# Altium integrated library Self made library.IntLib: 370 symbols (part 2 of 3)
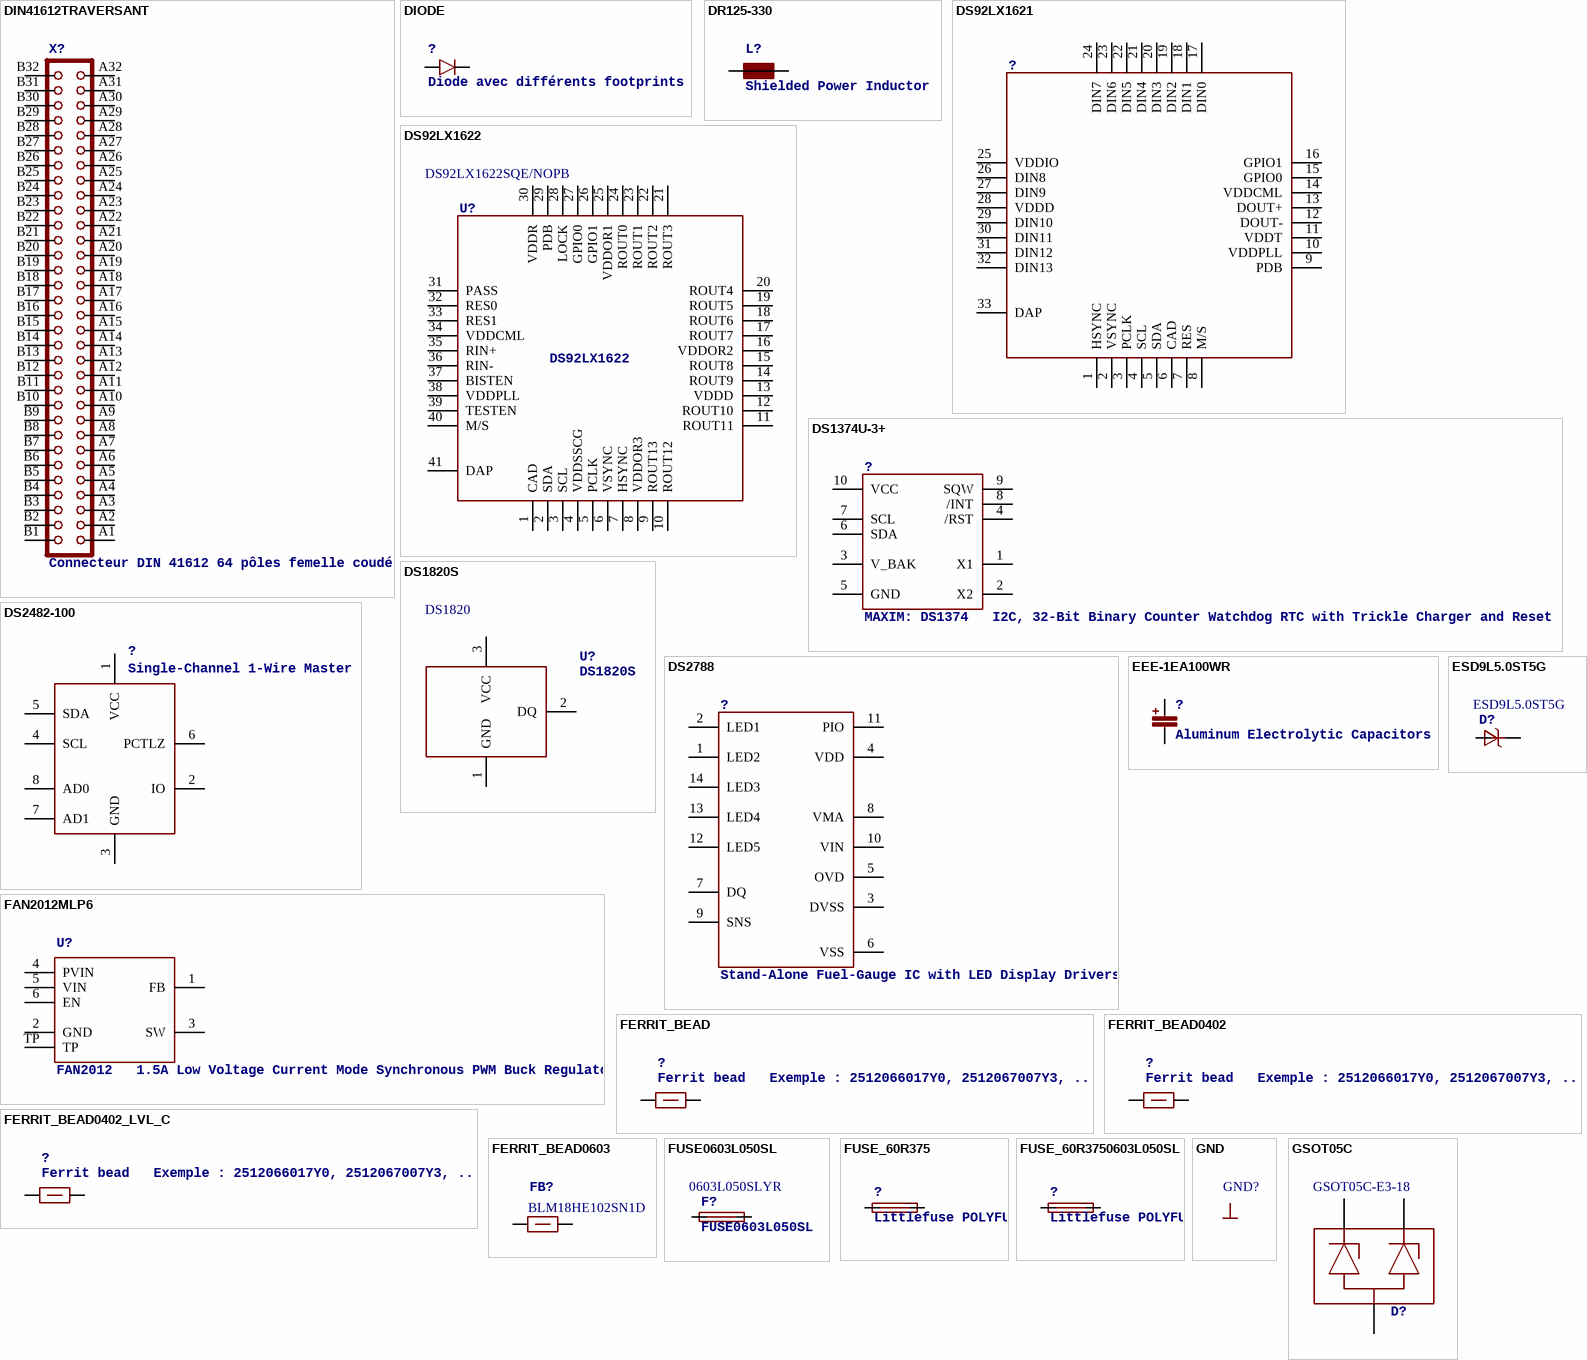
[diagram p21: symbols DIN41612TRAVERSANT to GSOT05C]

## EEE-1EA100WR
designator ?, comment Aluminum Electrolytic Capacitors
MANUFACTURER: Panasonic; MANUFACTURER_PART_NUMBER: EEE-1EA100WR; UNIT_PRICE: 0.304; SUPPLIER: mouser; SUPPLIER_PART_NUMBER: 667-EEE-1EA100WR
footprint EEE-1EA100WR
pins: +, -

## ESD9L5.0ST5G
designator D?, comment Manufacturer Part Number 1: ESD9L5.0ST5G  (hidden comment: ESD Protection Diodes with Ultra−Low Capacitance)
MANUFACTURER: ON Semiconductor; UNIT_PRICE: 0.5; Description 1: Diodes TVS - Parasurtenseurs ESD PROT DIODE UNI; Tension de rupture: 5.4 V; Capacité électrique: 0.5 pF; Blocage de la tension: 9.8 V; Tension de fonctionnement: 5 V; Package/Boîte: SOD-923; Conditionnement: Reel; Série: ESD9L; Style du raccordement: SMD/SMT; Courant de surtension de pointe: 1 A; Température de fonctionnement max.: + 125 C; Température de fonctionnement min.: - 55 C; Polarité: Unidirectional; Catégorie du produit: Low Capacitance ESD; Quantité standard du lot: 8000; MANUFACTURER_PART_NUMBER: ESD9L5.0ST5G; SUPPLIER: mouser; SUPPLIER_PART_NUMBER: 863-ESD9L5.0ST5G; Supplier 1: Mouser; Supplier Part Number 1: 863-ESD9L5.0ST5G; Manufacturer 1: ON Semiconductor; RoHS: RoHS Compliant; Category: Diodes TVS - Parasurtenseurs; Stock 1: 12650; Pricing 1: 1=0.465, 10=0.271, 100=0.128, 1000=0.099, 2500=0.084, 8000=0.076, 24000=0.071, 48000=0.064, 96000=0.062 (CHF); Dimensions: 0.6 mm W x 0.8 mm L x 0.37 mm H; Marque: ON Semiconductor; Style de montage: SMD/SMT; Fabricant: ON Semiconductor; RoHS - Mouser: Y; Minimum Order Quantity: 1; Reeling: True; ComponentLink1URL: http://www.mouser.com/ds/2/308/ESD9L-D-278322.pdf; ComponentLink1Description: http://www.mouser.com/ds/2/308/ESD9L-D-278322.pdf
footprint ESD9L5.0ST5G
pins: A, C

## FAN2012MLP6
designator U?, comment FAN2012   1.5A Low Voltage Current Mode Synchronous PWM Buck Regulator
footprint MLP6
pins: 1 FB, 2 GND, 3 SW, 4 PVIN, 5 VIN, 6 EN, TP

## FERRIT_BEAD
designator ?, comment Ferrit bead   Exemple : 2512066017Y0, 2512067007Y3, ...
footprint 1206
pins: 1, 2

## FERRIT_BEAD0402
designator ?, comment Ferrit bead   Exemple : 2512066017Y0, 2512067007Y3, ...
footprint R0402
pins: 1, 2

## FERRIT_BEAD0402_LVL_C
designator ?, comment Ferrit bead   Exemple : 2512066017Y0, 2512067007Y3, ...
MANUFACTURER: Murata; MANUFACTURER_PART_NUMBER: BLM15AX102SN1D; UNIT_PRICE: 0.12; SUPPLIER: Mouser; SUPPLIER_PART_NUMBER: 81-BLM15AX102SN1D
footprint C0402_LVL_C
pins: 1, 2

## FERRIT_BEAD0603
designator FB?  Manufacturer Part Number: BLM18HE102SN1D
Manufacturer: Murata Electronics; Impedance: 1 kOhms; Maximum DC Current: 600 mA; Maximum DC Resistance: 350 mOhms; Tolerance: 25 %; Case Height: 0.8 mm; Case Length: 1.6 mm; Test Frequency: 100 MHz; Supplier 1: Mouser; RoHS: RoHS Compliant; Category: EMI Filter Beads, Chips & Arrays; Stock 1: 5973; Pricing 1: 1=0.216, 10=0.119, 100=0.082, 500=0.074, 1000=0.061, 4000=0.056, 8000=0.048, 24000=0.046 (CHF); Capacitance: -; Dimensions: 0.8 mm W x 1.6 mm L x 0.8 mm H; Operating Temperature Range: - 55 C to + 125 C; Package/Case: 0603 (1608 metric); Packaging: Reel; Product: Ferrite Chip Beads; Series: BLM; Termination Style: SMD/SMT; Brand: Murata Electronics; Case Width: 0.8 mm; Product Category: SMD EMI Filters/Chip Ferrite Beads; Standard Pack Qty: 4000; RoHS - Mouser: Y; Minimum Order Quantity: 1; Reeling: True; ComponentLink1URL: http://search.murata.co.jp/Ceramy/CatalogAction.do?sHinnm=?&nbsp&sNHinnm=BLM18HE102SN1D&sNhin_key=BLM18HE102SN1D&sLang=en; ComponentLink1Description: http://search.murata.co.jp/Ceramy/CatalogAction.do?sHinnm=?&nbsp&sNHinnm=BLM18HE102SN1D&sNhin_key=BLM18HE102SN1D&sLang=en; Supplier Part Number 1: 81-BLM18HE102SN1D
footprint 0603
pins: 1, 2

## FUSE0603L050SL
designator F?  Manufacturer Part Number 1: 0603L050SLYR
MANUFACTURER: Littelfuse; UNIT_PRICE: 1.74; Description 1: Fusibles réarmables - PPTC 6V POLYFUSE 0603 LoRho SL 0.50A; Plage de températures de fonctionnement: - 40 C to + 85 C; Package/Boîte: 0603 (1608 metric); Conditionnement: Reel; Résistance: 350 mOhms; Série: LoRho; Style du raccordement: SMD/SMT; Type: PolyFuse Resettable PTC; Courant nominal maximal: 50 A; Courant maintenu: 0.5 A; Tension max.: 6 V; Courant de déclenchement: 1 A; Quantité standard du lot: 4000; MANUFACTURER_PART_NUMBER: 0603L050SLYR; SUPPLIER: Mouser; SUPPLIER_PART_NUMBER: 576-0603L050SLYR; Supplier 1: Mouser; Supplier Part Number 1: 576-0603L050SLYR; Manufacturer 1: Littelfuse; RoHS: RoHS Compliant; Category: Fusibles réarmables - PPTC; Stock 1: 2638; Pricing 1: 1=1.81, 10=1.55, 50=1.32, 100=1.11, 200=1.08, 500=0.919, 1000=0.816, 4000=0.685 (CHF); Dimensions: 1.8 mm L x 1 mm W x 0.75 mm  H; Marque: Littelfuse; Style de montage: SMD/SMT; Fabricant: Littelfuse; RoHS - Mouser: Y; Minimum Order Quantity: 1; Reeling: True; ComponentLink1URL: http://www.mouser.com/ds/2/240/Littelfuse_PTC_LoRho_Datasheet.pdf-365270.pdf; ComponentLink1Description: http://www.mouser.com/ds/2/240/Littelfuse_PTC_LoRho_Datasheet.pdf-365270.pdf
footprint R0603
pins: 1, 2

## FUSE_60R375
designator ?, comment Littlefuse POLYFUSE® Resettable PTCs 60R series60R375XH: Ihold=2.36 A@ 60°C; 60V; sw=7.5A @23°C
footprint LF60R375
pins: 1, 2

## FUSE_60R3750603L050SL
designator ?, comment Littlefuse POLYFUSE® Resettable PTCs 60R series60R375XH: Ihold=2.36 A@ 60°C; 60V; sw=7.5A @23°C
footprint 0603
pins: 1 2, 2 1

## GND
designator GND?
pins: ?1 GND (oe)

## GSOT05C
designator D?, comment Manufacturer Part Number 1: GSOT05C-E3-18  (hidden comment: Two-Line ESD Protection in SOT-23)
MANUFACTURER: Vishay Semiconductors; MANUFACTURER_PART_NUMBER: GSOT05C-E3-08; UNIT_PRICE: 0.49; Description 1: Barrettes de diodes TVS 5.0 Volt 300 Watt Common Anode; Tension de rupture: 6.8 V; Capacité électrique: 260 pF; Blocage de la tension: 7 V; Tension de fonctionnement: 5 V; Package/Boîte: SOT-23-3; Conditionnement: Reel; Série: GSOT05C; Style du raccordement: SMD/SMT; Canaux: 2 Channel; Courant de surtension de pointe: 30 A; Fabricant: Vishay; Température de fonctionnement max.: + 150 C; Température de fonctionnement min.: - 55 C; Dissipation de la puissance d'impulsion de crête: 612 W; Polarité: Bidirectional; Catégorie du produit: Transient Voltage Suppressors; Product Status: New at Mouser; SUPPLIER: mouser; SUPPLIER_PART_NUMBER: 78-GSOT05C-E3-08; Supplier 1: Mouser; Supplier Part Number 1: 78-GSOT05C-E3-18; Manufacturer 1: Vishay Semiconductors; RoHS: RoHS Compliant; Category: Barrettes de diodes TVS; Stock 1: 0; Pricing 1: 1=0.456, 10=0.269, 100=0.156, 500=0.127, 1000=0.098, 2500=0.085, 5000=0.081, 10000=0.074, 20000=0.069 (CHF); Dimensions: 1.2 mm W x 2.8 mm L x 0.9 mm H; Marque: Vishay Semiconductors; Style de montage: SMD/SMT; RoHS - Mouser: Y; Minimum Order Quantity: 1; Reeling: True; ComponentLink1URL: http://www.mouser.com/ds/2/427/gsot03c-243311.pdf; ComponentLink1Description: http://www.mouser.com/ds/2/427/gsot03c-243311.pdf
footprint SOT23
pins: 1, 2, 3

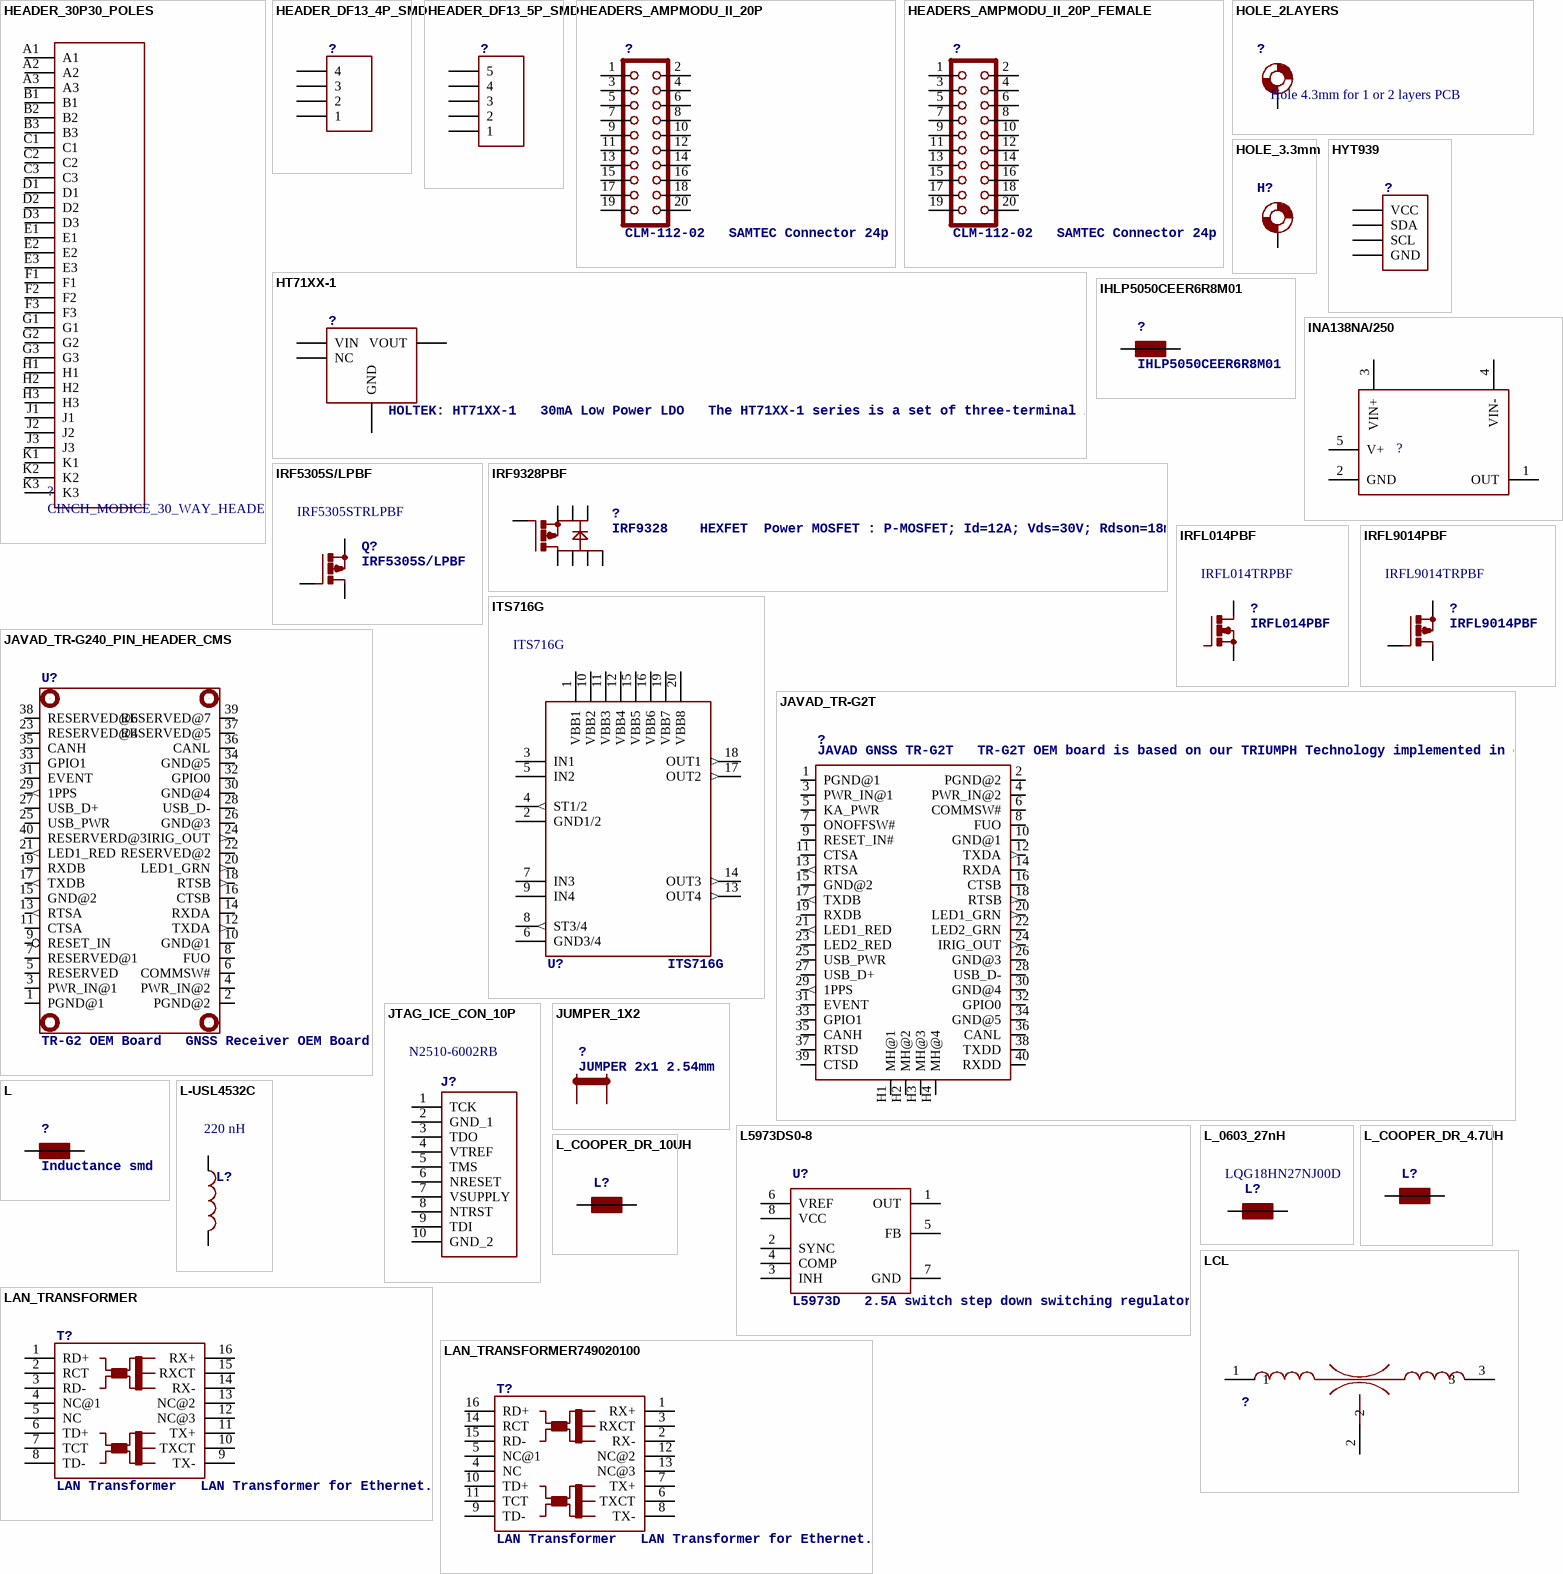
[diagram p11: symbols HEADER_30P30_POLES to LCL]

## HEADER_30P30_POLES
designator ?, comment CINCH_MODICE_30_WAY_HEADER
footprint CINCH_MODICE_30_WAY_HEADER
pins: A1, A2, A3, B1, B2, B3, C1, C2, C3, D1, D2, D3, E1, E2, E3, F1, F2, F3, G1, G2, G3, H1, H2, H3, J1, J2, J3, K1, K2, K3

## HEADER_DF13_4P_SMD
designator ?
MANUFACTURER: Hirose Connector; MANUFACTURER_PART_NUMBER: DF13-4P-1.25H(51); UNIT_PRICE: 1.00; SUPPLIER: Mouser; SUPPLIER_PART_NUMBER: 798-DF134P125H51
footprint HEADER_DF13_SMD_4P
pins: 1, 2, 3, 4

## HEADER_DF13_5P_SMD
designator ?
pins: ?1 1, ?2 2, ?3 3, ?4 4, ?5 5

## HEADERS_AMPMODU_II_20P
designator ?, comment CLM-112-02   SAMTEC Connector 24p
MANUFACTURER: TE Connectivity; MANUFACTURER_PART_NUMBER: 6-146256-0; UNIT_PRICE: 2.47; SUPPLIER: Mouser; SUPPLIER_PART_NUMBER: 571-6-146256-0
footprint CONNECTOR_20P
pins: 1, 2, 3, 4, 5, 6, 7, 8, 9, 10, 11, 12, 13, 14, 15, 16, 17, 18, 19, 20

## HEADERS_AMPMODU_II_20P_FEMALE
designator ?, comment CLM-112-02   SAMTEC Connector 24p
MANUFACTURER: 3M Electronic; MANUFACTURER_PART_NUMBER: 929852-01-10-RB; UNIT_PRICE: 1.46; SUPPLIER: Mouser; SUPPLIER_PART_NUMBER: 517-929852-01-10-RB
footprint CONNECTOR_20P
pins: 1, 2, 3, 4, 5, 6, 7, 8, 9, 10, 11, 12, 13, 14, 15, 16, 17, 18, 19, 20

## HOLE_2LAYERS
designator ?, comment Hole 4.3mm for 1 or 2 layers PCB
footprint HOLE_4.3_2LAYERS
pins: P$1 P$2

## HOLE_3.3mm
designator H?
footprint Hole_3.3
pins: 1

## HT71XX-1
designator ?, comment HOLTEK: HT71XX-1   30mA Low Power LDO   The HT71XX-1 series is a set of three-terminal low power high voltage regulators implemented in CMOS technology. They allow input voltages as high as 24V. They are available with several fixed output voltages ranging from 3.0V to 5.0V. CMOS technology ensures low voltage drop and low quiescent current.
footprint SOT-89_4PADS
pins: 1 GND, 2 VIN, 3 VOUT, PAD NC

## HYT939
designator ?
footprint PAD_X4_1.1
pins: 1 GND, 2 SCL, 3 SDA, 4 VCC

## IHLP5050CEER6R8M01
designator ?
footprint IHLP_Inductor
pins: 1, 2

## INA138NA/250
designator ?
footprint SOT-23-5
pins: 1 OUT, 2 GND, 3 VIN+, 4 VIN-, 5 V+

## IRF5305S/LPBF
designator Q?  Manufacturer Part Number: IRF5305STRLPBF
Manufacturer: International Rectifier; Transistor Polarity: P-Channel; Id - Continuous Drain Current: - 31 A; Pd - Power Dissipation: 110 W; Qg - Gate Charge: 42 nC; Rds On - Drain-Source Resistance: 60 mOhms; Vds - Drain-Source Breakdown Voltage: - 55 V; Vgs - Gate-Source Breakdown Voltage: 20 V; Digger CMP: CMP4450; Supplier 1: Mouser; RoHS: RoHS Compliant; Category: MOSFET; Stock 1: 3675; Pricing 1: 1=1.97, 10=1.04, 100=0.927, 500=0.869, 800=0.832, 2400=0.798, 4800=0.760, 9600=0.734 (CHF); Package/Case: D-PAK-3; Packaging: Reel; Brand: International Rectifier; Mounting Style: SMD/SMT; Standard Pack Qty: 800; RoHS - Mouser: Y; Minimum Order Quantity: 1; Reeling: True; ComponentLink1URL: http://www.mouser.com/ds/2/200/irf5305spbf-220642.pdf; ComponentLink1Description: http://www.mouser.com/ds/2/200/irf5305spbf-220642.pdf; Supplier Part Number 1: 942-IRF5305STRLPBF
footprint D2PACK
pins: 1 G, 2 D, 3 S

## IRF9328PBF
designator ?, comment IRF9328    HEXFET  Power MOSFET : P-MOSFET; Id=12A; Vds=30V; Rdson=18mR
footprint SOIC8
pins: 1 S@0, 2 S@1, 3 S@2, 4 G, 5 D@0, 6 D@1, 7 D@2, 8 D@3

## IRFL014PBF
designator ?  Manufacturer Part Number: IRFL014TRPBF
Manufacturer: Vishay Semiconductors; Configuration: Single Dual Drain; Transistor Polarity: N-Channel; Channel Mode: Enhancement; Fall Time: 19 ns; Id - Continuous Drain Current: 2.7 A; Pd - Power Dissipation: 2 W; Rds On - Drain-Source Resistance: 200 mOhms; Rise Time: 50 ns; Typical Turn-Off Delay Time: 13 ns; Vds - Drain-Source Breakdown Voltage: 60 V; Vgs - Gate-Source Breakdown Voltage: 20 V; Digger CMP: CMP4448; Supplier 1: Mouser; RoHS: RoHS Compliant By Exemption; Category: MOSFET; Stock 1: 2936; Pricing 1: 1=0.580, 10=0.528, 2500=0.528 (CHF); Package/Case: SOT-223-3; Packaging: Reel; Brand: Vishay Semiconductors; Mounting Style: SMD/SMT; Maximum Operating Temperature: + 150 C; Minimum Operating Temperature: - 55 C; Product Category: Single-Gate MOSFET Transistors; Standard Pack Qty: 2500; RoHS - Mouser: E; Minimum Order Quantity: 1; Reeling: True; ComponentLink1URL: http://www.mouser.com/ds/2/427/sihfl014-108589.pdf; ComponentLink1Description: http://www.mouser.com/ds/2/427/sihfl014-108589.pdf; Supplier Part Number 1: 844-IRFL014TRPBF
footprint SOT223
pins: 1 G, 2 D, 3 S

## IRFL9014PBF
designator ?  Manufacturer Part Number: IRFL9014TRPBF
Manufacturer: Vishay Semiconductors; Configuration: Single Dual Drain; Transistor Polarity: P-Channel; Channel Mode: Enhancement; Fall Time: 31 ns; Id - Continuous Drain Current: 1.8 A; Pd - Power Dissipation: 2 W; Rds On - Drain-Source Resistance: 500 mOhms; Rise Time: 63 ns; Typical Turn-Off Delay Time: 9.6 ns; Vds - Drain-Source Breakdown Voltage: - 60 V; Vgs - Gate-Source Breakdown Voltage: 20 V; Digger CMP: CMP4449; Supplier 1: Mouser; RoHS: RoHS Compliant By Exemption; Category: MOSFET; Stock 1: 3653; Pricing 1: 1=0.675, 10=0.545, 2500=0.545 (CHF); Package/Case: SOT-223-3; Packaging: Reel; Series: IRF/SIHFL9014; Brand: Vishay Semiconductors; Mounting Style: SMD/SMT; Maximum Operating Temperature: + 150 C; Minimum Operating Temperature: - 55 C; Product Category: Single-Gate MOSFET Transistors; Standard Pack Qty: 2500; RoHS - Mouser: E; Minimum Order Quantity: 1; Reeling: True; ComponentLink1URL: http://www.mouser.com/ds/2/427/sihfl901-107496.pdf; ComponentLink1Description: http://www.mouser.com/ds/2/427/sihfl901-107496.pdf; Supplier Part Number 1: 844-IRFL9014TRPBF
footprint SOT223
pins: 1 G, 2 D, 3 S

## ITS716G
designator U?
Manufacturer: Infineon Technologies; Number of Outputs: 4 Output; Output Current: 5.3 A; On Resistance - Max: 0.028 Ohms; Supply Current - Max: 1.9 mA; Maximum Power Dissipation: 3600 mW; Digger DTR: CMP4447; Supplier 1: Mouser; RoHS: RoHS Compliant; Category: Power Switch ICs - Power Distribution; Stock 1: 624; Pricing 1: 1=4.10, 10=3.29, 100=3.00, 250=2.71, 500=2.43, 1000=2.05, 2000=1.95, 5000=1.87 (CHF); Package/Case: DSO-20; Packaging: Reel; Series: ITS716; Brand: Infineon Technologies; Mounting Style: SMD/SMT; Maximum Operating Temperature: + 85 C; Minimum Operating Temperature: - 30 C; Product Category: MOSFETs; Standard Pack Qty: 1000; RoHS - Mouser: Y; Minimum Order Quantity: 1; Reeling: True; ComponentLink1URL: http://www.infineon.com/dgdl/ITS716G_20060323.pdf?folderId=db3a304412b407950112b408e8c90004&fileId=db3a304412b407950112b428c2cf3e6d; ComponentLink1Description: http://www.infineon.com/dgdl/ITS716G_20060323.pdf?folderId=db3a304412b407950112b408e8c90004&fileId=db3a304412b407950112b428c2cf3e6d; Supplier Part Number 1: 726-ITS716G; Manufacturer Part Number: ITS716G
footprint PG-DSO-20
pins: 1 VBB1 (power), 2 GND1/2 (power), 3 IN1, 4 ST1/2 (out), 5 IN2, 6 GND3/4 (power), 7 IN3, 8 ST3/4 (out), 9 IN4, 10 VBB2 (power), 11 VBB3 (power), 12 VBB4 (power), 13 OUT4 (out), 14 OUT3 (out), 15 VBB5 (power), 16 VBB6 (power), 17 OUT2 (out), 18 OUT1 (out), 19 VBB7 (power), 20 VBB8 (power)

## JAVAD_TR-G2T
designator ?, comment JAVAD GNSS TR-G2T   TR-G2T OEM board is based on our TRIUMPH Technology implemented in our TRIUMPH Chip. For the first time in the GNSS history we offer up to 100 Hz RTK. The TR-G2T board tracks GPS /L2/L2C/L5 and Galileo E1/E5. The on-board power supply on TR-G2T OEM board accepts any voltage from +4.5 to +40 volts and delivers clean filtered voltage where needed. This eliminates the risk of power contamination (ripples) that can be created when clean power is generated elsewhere and delivered to the board via cables. TR-G2T board also includes drivers for four LEDs, ON/OFF and function button controllers. In addition, the board comes with large amount of flash for data storage. The CAN interface in TR-G2T board is provided complete with all associated hardware and firmware, not just the CAN bus. The same is true with all the serial RS232/RS422 ports in our board. Simply stated, additional functions are not needed to incorporate any of our TR-G2T OEM board in most applications. In addition to timing strobe and event marker, the TR-G2T OEM board includes the option of complete IRIG timing system.
UNIT_PRICE: 3300; MANUFACTURER: Javad; MANUFACTURER_PART_NUMBER: TR-G2T; SUPPLIER: Javad; SUPPLIER_PART_NUMBER: TR-G2T
footprint JAVAD-TR-G2T
pins: 1 PGND@1, 2 PGND@2, 3 PWR_IN@1, 4 PWR_IN@2, 5 KA_PWR, 6 COMMSW#, 7 ONOFFSW#, 8 FUO, 9 RESET_IN#, 10 GND@1 (power), 11 CTSA, 12 TXDA (out), 13 RTSA (out), 14 RXDA, 15 GND@2 (power), 16 CTSB, 17 TXDB (out), 18 RTSB (out), 19 RXDB, 20 LED1_GRN (out), 21 LED1_RED (out), 22 LED2_GRN, 23 LED2_RED, 24 IRIG_OUT (out), 25 USB_PWR, 26 GND@3 (power), 27 USB_D+, 28 USB_D-, 29 1PPS (out), 30 GND@4 (power), 31 EVENT, 32 GPIO0, 33 GPIO1, 34 GND@5 (power), 35 CANH, 36 CANL, 37 RTSD, 38 TXDD, 39 CTSD, 40 RXDD, H1 MH@1, H2 MH@2, H3 MH@3, H4 MH@4

## JAVAD_TR-G240_PIN_HEADER_CMS
designator U?, comment TR-G2 OEM Board   GNSS Receiver OEM Board
footprint JAVAD_TR2
pins: 1 PGND@1, 2 PGND@2, 3 PWR_IN@1, 4 PWR_IN@2, 5 RESERVED, 6 COMMSW#, 7 RESERVED@1, 8 FUO, 9 RESET_IN, 10 GND@1 (power), 11 CTSA, 12 TXDA (out), 13 RTSA (out), 14 RXDA, 15 GND@2 (power), 16 CTSB, 17 TXDB (out), 18 RTSB (out), 19 RXDB, 20 LED1_GRN (out), 21 LED1_RED (out), 22 RESERVED@2, 23 RESERVED@4, 24 IRIG_OUT (out), 25 USB_PWR, 26 GND@3 (power), 27 USB_D+, 28 USB_D-, 29 1PPS (out), 30 GND@4 (power), 31 EVENT, 32 GPIO0, 33 GPIO1, 34 GND@5 (power), 35 CANH, 36 CANL, 37 RESERVED@5, 38 RESERVED@6, 39 RESERVED@7, 40 RESERVERD@3, FIX1 MH@1, FIX2 MH@2, FIX3 MH@3, FIX4 MH@4

## JTAG_ICE_CON_10P
designator J?  Manufacturer Part Number: N2510-6002RB  (hidden comment: JTAG_ICE_CON_10P)